# Altium schematic symbol library jlcpcb_2025_04_capacitors_extended_0603.schlib: 3668 symbols (part 8 of 20) (continued)
## CC0603BRNPO9BN1R0
designator C?  Capacitance: 1pF  (hidden comment: *)
Capacitor, Ceramic (MLCC), 1pF, 50V, NP0, SMD 0603; Manufacturer: YAGEO; Manufacturer Part Number: CC0603BRNPO9BN1R0; Package Size: 0603; JLCPCB Basic Part: No; JLCPCB Part Number: C115062; Supplier 1: LCSC; Category: Capacitors - MLCC; Supplier Part Number 1: C115062; Voltage Rating: 50V; Temperature Coefficient: NP0; RoHS: Yes; ComponentLink1Description: Datasheet; ComponentLink1URL: https://wmsc.lcsc.com/wmsc/upload/file/pdf/v2/lcsc/2007151105_YAGEO-CC0603BRNPO9BN1R0_C115062.pdf; ComponentLink2Description: JLCPCB Part URL; ComponentLink2URL: https://jlcpcb.com/partdetail/C115062; ComponentLink3Description: LCSC Part URL; ComponentLink3URL: https://lcsc.com/product-detail/Multilayer-Ceramic-Capacitors-MLCC---SMD-SMT_YAGEO-YAGEO-CC0603BRNPO9BN1R0_C115062.html
footprint CAP-0603 (0603 (1608M) Capacitor)
pins: 1, 2

## CC0603BRNPO9BN1R1
designator C?  Capacitance: 1.1pF  (hidden comment: *)
Capacitor, Ceramic (MLCC), 1.1pF, 50V, NP0, SMD 0603; Manufacturer: YAGEO; Manufacturer Part Number: CC0603BRNPO9BN1R1; Package Size: 0603; JLCPCB Basic Part: No; JLCPCB Part Number: C519097; Supplier 1: LCSC; Category: Capacitors - MLCC; Supplier Part Number 1: C519097; Voltage Rating: 50V; Temperature Coefficient: NP0; RoHS: Yes; ComponentLink1Description: Datasheet; ComponentLink1URL: https://wmsc.lcsc.com/wmsc/upload/file/pdf/v2/lcsc/2007161233_YAGEO-CC0603BRNPO9BN1R1_C519097.pdf; ComponentLink2Description: JLCPCB Part URL; ComponentLink2URL: https://jlcpcb.com/partdetail/C519097; ComponentLink3Description: LCSC Part URL; ComponentLink3URL: https://lcsc.com/product-detail/Multilayer-Ceramic-Capacitors-MLCC---SMD-SMT_YAGEO-YAGEO-CC0603BRNPO9BN1R1_C519097.html
footprint CAP-0603 (0603 (1608M) Capacitor)
pins: 1, 2

## CC0603BRNPO9BN1R2
designator C?  Capacitance: 1.2pF  (hidden comment: *)
Capacitor, Ceramic (MLCC), 1.2pF, 50V, NP0, SMD 0603; Manufacturer: YAGEO; Manufacturer Part Number: CC0603BRNPO9BN1R2; Package Size: 0603; JLCPCB Basic Part: No; JLCPCB Part Number: C519098; Supplier 1: LCSC; Category: Capacitors - MLCC; Supplier Part Number 1: C519098; Voltage Rating: 50V; Temperature Coefficient: NP0; RoHS: Yes; ComponentLink1Description: Datasheet; ComponentLink1URL: https://wmsc.lcsc.com/wmsc/upload/file/pdf/v2/lcsc/2008031233_YAGEO-CC0603BRNPO9BN1R2_C519098.pdf; ComponentLink2Description: JLCPCB Part URL; ComponentLink2URL: https://jlcpcb.com/partdetail/C519098; ComponentLink3Description: LCSC Part URL; ComponentLink3URL: https://lcsc.com/product-detail/Multilayer-Ceramic-Capacitors-MLCC---SMD-SMT_YAGEO-YAGEO-CC0603BRNPO9BN1R2_C519098.html
footprint CAP-0603 (0603 (1608M) Capacitor)
pins: 1, 2

## CC0603BRNPO9BN1R3
designator C?  Capacitance: 1.3pF  (hidden comment: *)
Capacitor, Ceramic (MLCC), 1.3pF, 50V, NP0, SMD 0603; Manufacturer: YAGEO; Manufacturer Part Number: CC0603BRNPO9BN1R3; Package Size: 0603; JLCPCB Basic Part: No; JLCPCB Part Number: C519099; Supplier 1: LCSC; Category: Capacitors - MLCC; Supplier Part Number 1: C519099; Voltage Rating: 50V; Temperature Coefficient: NP0; RoHS: Yes; ComponentLink1Description: Datasheet; ComponentLink1URL: https://wmsc.lcsc.com/wmsc/upload/file/pdf/v2/lcsc/2006011834_YAGEO-CC0603BRNPO9BN1R3_C519099.pdf; ComponentLink2Description: JLCPCB Part URL; ComponentLink2URL: https://jlcpcb.com/partdetail/C519099; ComponentLink3Description: LCSC Part URL; ComponentLink3URL: https://lcsc.com/product-detail/Multilayer-Ceramic-Capacitors-MLCC---SMD-SMT_YAGEO-YAGEO-CC0603BRNPO9BN1R3_C519099.html
footprint CAP-0603 (0603 (1608M) Capacitor)
pins: 1, 2

## CC0603BRNPO9BN1R5
designator C?  Capacitance: 1.5pF  (hidden comment: *)
Capacitor, Ceramic (MLCC), 1.5pF, 50V, NP0, SMD 0603; Manufacturer: YAGEO; Manufacturer Part Number: CC0603BRNPO9BN1R5; Package Size: 0603; JLCPCB Basic Part: No; JLCPCB Part Number: C519100; Supplier 1: LCSC; Category: Capacitors - MLCC; Supplier Part Number 1: C519100; Voltage Rating: 50V; Temperature Coefficient: NP0; RoHS: Yes; ComponentLink1Description: Datasheet; ComponentLink1URL: https://wmsc.lcsc.com/wmsc/upload/file/pdf/v2/lcsc/2005181834_YAGEO-CC0603BRNPO9BN1R5_C519100.pdf; ComponentLink2Description: JLCPCB Part URL; ComponentLink2URL: https://jlcpcb.com/partdetail/C519100; ComponentLink3Description: LCSC Part URL; ComponentLink3URL: https://lcsc.com/product-detail/Multilayer-Ceramic-Capacitors-MLCC---SMD-SMT_YAGEO-YAGEO-CC0603BRNPO9BN1R5_C519100.html
footprint CAP-0603 (0603 (1608M) Capacitor)
pins: 1, 2

## CC0603BRNPO9BN1R8
designator C?  Capacitance: 1.8pF  (hidden comment: *)
Capacitor, Ceramic (MLCC), 1.8pF, 50V, NP0, SMD 0603; Manufacturer: YAGEO; Manufacturer Part Number: CC0603BRNPO9BN1R8; Package Size: 0603; JLCPCB Basic Part: No; JLCPCB Part Number: C519101; Supplier 1: LCSC; Category: Capacitors - MLCC; Supplier Part Number 1: C519101; Voltage Rating: 50V; Temperature Coefficient: NP0; RoHS: Yes; ComponentLink1Description: Datasheet; ComponentLink1URL: https://wmsc.lcsc.com/wmsc/upload/file/pdf/v2/lcsc/2005141203_YAGEO-CC0603BRNPO9BN1R8_C519101.pdf; ComponentLink2Description: JLCPCB Part URL; ComponentLink2URL: https://jlcpcb.com/partdetail/C519101; ComponentLink3Description: LCSC Part URL; ComponentLink3URL: https://lcsc.com/product-detail/Multilayer-Ceramic-Capacitors-MLCC---SMD-SMT_YAGEO-YAGEO-CC0603BRNPO9BN1R8_C519101.html
footprint CAP-0603 (0603 (1608M) Capacitor)
pins: 1, 2

## CC0603BRNPO9BN2R0
designator C?  Capacitance: 2pF  (hidden comment: *)
Capacitor, Ceramic (MLCC), 2pF, 50V, NP0, SMD 0603; Manufacturer: YAGEO; Manufacturer Part Number: CC0603BRNPO9BN2R0; Package Size: 0603; JLCPCB Basic Part: No; JLCPCB Part Number: C513620; Supplier 1: LCSC; Category: Capacitors - MLCC; Supplier Part Number 1: C513620; Voltage Rating: 50V; Temperature Coefficient: NP0; RoHS: Yes; ComponentLink1Description: Datasheet; ComponentLink1URL: https://wmsc.lcsc.com/wmsc/upload/file/pdf/v2/lcsc/2004231433_YAGEO-CC0603BRNPO9BN2R0_C513620.pdf; ComponentLink2Description: JLCPCB Part URL; ComponentLink2URL: https://jlcpcb.com/partdetail/C513620; ComponentLink3Description: LCSC Part URL; ComponentLink3URL: https://lcsc.com/product-detail/Multilayer-Ceramic-Capacitors-MLCC---SMD-SMT_YAGEO-YAGEO-CC0603BRNPO9BN2R0_C513620.html
footprint CAP-0603 (0603 (1608M) Capacitor)
pins: 1, 2

## CC0603BRNPO9BN2R2
designator C?  Capacitance: 2.2pF  (hidden comment: *)
Capacitor, Ceramic (MLCC), 2.2pF, 50V, NP0, SMD 0603; Manufacturer: YAGEO; Manufacturer Part Number: CC0603BRNPO9BN2R2; Package Size: 0603; JLCPCB Basic Part: No; JLCPCB Part Number: C309460; Supplier 1: LCSC; Category: Capacitors - MLCC; Supplier Part Number 1: C309460; Voltage Rating: 50V; Temperature Coefficient: NP0; RoHS: Yes; ComponentLink1Description: Datasheet; ComponentLink1URL: https://wmsc.lcsc.com/wmsc/upload/file/pdf/v2/lcsc/2304140030_YAGEO-CC0603BRNPO9BN2R2_C309460.pdf; ComponentLink2Description: JLCPCB Part URL; ComponentLink2URL: https://jlcpcb.com/partdetail/C309460; ComponentLink3Description: LCSC Part URL; ComponentLink3URL: https://lcsc.com/product-detail/Multilayer-Ceramic-Capacitors-MLCC---SMD-SMT_YAGEO-YAGEO-CC0603BRNPO9BN2R2_C309460.html
footprint CAP-0603 (0603 (1608M) Capacitor)
pins: 1, 2

## CC0603BRNPO9BN2R4
designator C?  Capacitance: 2.4pF  (hidden comment: *)
Capacitor, Ceramic (MLCC), 2.4pF, 50V, NP0, SMD 0603; Manufacturer: YAGEO; Manufacturer Part Number: CC0603BRNPO9BN2R4; Package Size: 0603; JLCPCB Basic Part: No; JLCPCB Part Number: C519102; Supplier 1: LCSC; Category: Capacitors - MLCC; Supplier Part Number 1: C519102; Voltage Rating: 50V; Temperature Coefficient: NP0; RoHS: Yes; ComponentLink1Description: Datasheet; ComponentLink1URL: https://wmsc.lcsc.com/wmsc/upload/file/pdf/v2/lcsc/2007101233_YAGEO-CC0603BRNPO9BN2R4_C519102.pdf; ComponentLink2Description: JLCPCB Part URL; ComponentLink2URL: https://jlcpcb.com/partdetail/C519102; ComponentLink3Description: LCSC Part URL; ComponentLink3URL: https://lcsc.com/product-detail/Multilayer-Ceramic-Capacitors-MLCC---SMD-SMT_YAGEO-YAGEO-CC0603BRNPO9BN2R4_C519102.html
footprint CAP-0603 (0603 (1608M) Capacitor)
pins: 1, 2

## CC0603BRNPO9BN2R5
designator C?  Capacitance: 2.5pF  (hidden comment: *)
Capacitor, Ceramic (MLCC), 2.5pF, 50V, NP0, SMD 0603; Manufacturer: YAGEO; Manufacturer Part Number: CC0603BRNPO9BN2R5; Package Size: 0603; JLCPCB Basic Part: No; JLCPCB Part Number: C519103; Supplier 1: LCSC; Category: Capacitors - MLCC; Supplier Part Number 1: C519103; Voltage Rating: 50V; Temperature Coefficient: NP0; RoHS: Yes; ComponentLink1Description: Datasheet; ComponentLink1URL: https://wmsc.lcsc.com/wmsc/upload/file/pdf/v2/lcsc/2008122133_YAGEO-CC0603BRNPO9BN2R5_C519103.pdf; ComponentLink2Description: JLCPCB Part URL; ComponentLink2URL: https://jlcpcb.com/partdetail/C519103; ComponentLink3Description: LCSC Part URL; ComponentLink3URL: https://lcsc.com/product-detail/Multilayer-Ceramic-Capacitors-MLCC---SMD-SMT_YAGEO-YAGEO-CC0603BRNPO9BN2R5_C519103.html
footprint CAP-0603 (0603 (1608M) Capacitor)
pins: 1, 2

## CC0603BRNPO9BN2R7
designator C?  Capacitance: 2.7pF  (hidden comment: *)
Capacitor, Ceramic (MLCC), 2.7pF, 50V, NP0, SMD 0603; Manufacturer: YAGEO; Manufacturer Part Number: CC0603BRNPO9BN2R7; Package Size: 0603; JLCPCB Basic Part: No; JLCPCB Part Number: C519104; Supplier 1: LCSC; Category: Capacitors - MLCC; Supplier Part Number 1: C519104; Voltage Rating: 50V; Temperature Coefficient: NP0; RoHS: Yes; ComponentLink1Description: Datasheet; ComponentLink1URL: https://wmsc.lcsc.com/wmsc/upload/file/pdf/v2/lcsc/2005141203_YAGEO-CC0603BRNPO9BN2R7_C519104.pdf; ComponentLink2Description: JLCPCB Part URL; ComponentLink2URL: https://jlcpcb.com/partdetail/C519104; ComponentLink3Description: LCSC Part URL; ComponentLink3URL: https://lcsc.com/product-detail/Multilayer-Ceramic-Capacitors-MLCC---SMD-SMT_YAGEO-YAGEO-CC0603BRNPO9BN2R7_C519104.html
footprint CAP-0603 (0603 (1608M) Capacitor)
pins: 1, 2

## CC0603BRNPO9BN3R0
designator C?  Capacitance: 3pF  (hidden comment: *)
Capacitor, Ceramic (MLCC), 3pF, 50V, NP0, SMD 0603; Manufacturer: YAGEO; Manufacturer Part Number: CC0603BRNPO9BN3R0; Package Size: 0603; JLCPCB Basic Part: No; JLCPCB Part Number: C519105; Supplier 1: LCSC; Category: Capacitors - MLCC; Supplier Part Number 1: C519105; Voltage Rating: 50V; Temperature Coefficient: NP0; RoHS: Yes; ComponentLink1Description: Datasheet; ComponentLink1URL: https://wmsc.lcsc.com/wmsc/upload/file/pdf/v2/lcsc/2005141203_YAGEO-CC0603BRNPO9BN3R0_C519105.pdf; ComponentLink2Description: JLCPCB Part URL; ComponentLink2URL: https://jlcpcb.com/partdetail/C519105; ComponentLink3Description: LCSC Part URL; ComponentLink3URL: https://lcsc.com/product-detail/Multilayer-Ceramic-Capacitors-MLCC---SMD-SMT_YAGEO-YAGEO-CC0603BRNPO9BN3R0_C519105.html
footprint CAP-0603 (0603 (1608M) Capacitor)
pins: 1, 2

## CC0603BRNPO9BN3R3
designator C?  Capacitance: 3.3pF  (hidden comment: *)
Capacitor, Ceramic (MLCC), 3.3pF, 50V, NP0, SMD 0603; Manufacturer: YAGEO; Manufacturer Part Number: CC0603BRNPO9BN3R3; Package Size: 0603; JLCPCB Basic Part: No; JLCPCB Part Number: C327275; Supplier 1: LCSC; Category: Capacitors - MLCC; Supplier Part Number 1: C327275; Voltage Rating: 50V; Temperature Coefficient: NP0; RoHS: Yes; ComponentLink1Description: Datasheet; ComponentLink1URL: https://wmsc.lcsc.com/wmsc/upload/file/pdf/v2/lcsc/1811141224_YAGEO-CC0603BRNPO9BN3R3_C327275.pdf; ComponentLink2Description: JLCPCB Part URL; ComponentLink2URL: https://jlcpcb.com/partdetail/C327275; ComponentLink3Description: LCSC Part URL; ComponentLink3URL: https://lcsc.com/product-detail/Multilayer-Ceramic-Capacitors-MLCC---SMD-SMT_YAGEO-YAGEO-CC0603BRNPO9BN3R3_C327275.html
footprint CAP-0603 (0603 (1608M) Capacitor)
pins: 1, 2

## CC0603BRNPO9BN3R6
designator C?  Capacitance: 3.6pF  (hidden comment: *)
Capacitor, Ceramic (MLCC), 3.6pF, 50V, NP0, SMD 0603; Manufacturer: YAGEO; Manufacturer Part Number: CC0603BRNPO9BN3R6; Package Size: 0603; JLCPCB Basic Part: No; JLCPCB Part Number: C519106; Supplier 1: LCSC; Category: Capacitors - MLCC; Supplier Part Number 1: C519106; Voltage Rating: 50V; Temperature Coefficient: NP0; RoHS: Yes; ComponentLink1Description: Datasheet; ComponentLink1URL: https://wmsc.lcsc.com/wmsc/upload/file/pdf/v2/lcsc/2005141203_YAGEO-CC0603BRNPO9BN3R6_C519106.pdf; ComponentLink2Description: JLCPCB Part URL; ComponentLink2URL: https://jlcpcb.com/partdetail/C519106; ComponentLink3Description: LCSC Part URL; ComponentLink3URL: https://lcsc.com/product-detail/Multilayer-Ceramic-Capacitors-MLCC---SMD-SMT_YAGEO-YAGEO-CC0603BRNPO9BN3R6_C519106.html
footprint CAP-0603 (0603 (1608M) Capacitor)
pins: 1, 2

## CC0603BRNPO9BN3R9
designator C?  Capacitance: 3.9pF  (hidden comment: *)
Capacitor, Ceramic (MLCC), 3.9pF, 50V, NP0, SMD 0603; Manufacturer: YAGEO; Manufacturer Part Number: CC0603BRNPO9BN3R9; Package Size: 0603; JLCPCB Basic Part: No; JLCPCB Part Number: C519107; Supplier 1: LCSC; Category: Capacitors - MLCC; Supplier Part Number 1: C519107; Voltage Rating: 50V; Temperature Coefficient: NP0; RoHS: Yes; ComponentLink1Description: Datasheet; ComponentLink1URL: https://wmsc.lcsc.com/wmsc/upload/file/pdf/v2/lcsc/2007231533_YAGEO-CC0603BRNPO9BN3R9_C519107.pdf; ComponentLink2Description: JLCPCB Part URL; ComponentLink2URL: https://jlcpcb.com/partdetail/C519107; ComponentLink3Description: LCSC Part URL; ComponentLink3URL: https://lcsc.com/product-detail/Multilayer-Ceramic-Capacitors-MLCC---SMD-SMT_YAGEO-YAGEO-CC0603BRNPO9BN3R9_C519107.html
footprint CAP-0603 (0603 (1608M) Capacitor)
pins: 1, 2

## CC0603BRNPO9BN4R0
designator C?  Capacitance: 4pF  (hidden comment: *)
Capacitor, Ceramic (MLCC), 4pF, 50V, NP0, SMD 0603; Manufacturer: YAGEO; Manufacturer Part Number: CC0603BRNPO9BN4R0; Package Size: 0603; JLCPCB Basic Part: No; JLCPCB Part Number: C309461; Supplier 1: LCSC; Category: Capacitors - MLCC; Supplier Part Number 1: C309461; Voltage Rating: 50V; Temperature Coefficient: NP0; RoHS: Yes; ComponentLink1Description: Datasheet; ComponentLink1URL: https://wmsc.lcsc.com/wmsc/upload/file/pdf/v2/lcsc/2304140030_YAGEO-CC0603BRNPO9BN4R0_C309461.pdf; ComponentLink2Description: JLCPCB Part URL; ComponentLink2URL: https://jlcpcb.com/partdetail/C309461; ComponentLink3Description: LCSC Part URL; ComponentLink3URL: https://lcsc.com/product-detail/Multilayer-Ceramic-Capacitors-MLCC---SMD-SMT_YAGEO-YAGEO-CC0603BRNPO9BN4R0_C309461.html
footprint CAP-0603 (0603 (1608M) Capacitor)
pins: 1, 2

## CC0603BRNPO9BN4R3
designator C?  Capacitance: 4.3pF  (hidden comment: *)
Capacitor, Ceramic (MLCC), 4.3pF, 50V, NP0, SMD 0603; Manufacturer: YAGEO; Manufacturer Part Number: CC0603BRNPO9BN4R3; Package Size: 0603; JLCPCB Basic Part: No; JLCPCB Part Number: C519108; Supplier 1: LCSC; Category: Capacitors - MLCC; Supplier Part Number 1: C519108; Voltage Rating: 50V; Temperature Coefficient: NP0; RoHS: Yes; ComponentLink1Description: Datasheet; ComponentLink1URL: https://wmsc.lcsc.com/wmsc/upload/file/pdf/v2/lcsc/2005181834_YAGEO-CC0603BRNPO9BN4R3_C519108.pdf; ComponentLink2Description: JLCPCB Part URL; ComponentLink2URL: https://jlcpcb.com/partdetail/C519108; ComponentLink3Description: LCSC Part URL; ComponentLink3URL: https://lcsc.com/product-detail/Multilayer-Ceramic-Capacitors-MLCC---SMD-SMT_YAGEO-YAGEO-CC0603BRNPO9BN4R3_C519108.html
footprint CAP-0603 (0603 (1608M) Capacitor)
pins: 1, 2

## CC0603BRNPO9BN4R7
designator C?  Capacitance: 4.7pF  (hidden comment: *)
Capacitor, Ceramic (MLCC), 4.7pF, 50V, NP0, SMD 0603; Manufacturer: YAGEO; Manufacturer Part Number: CC0603BRNPO9BN4R7; Package Size: 0603; JLCPCB Basic Part: No; JLCPCB Part Number: C327022; Supplier 1: LCSC; Category: Capacitors - MLCC; Supplier Part Number 1: C327022; Voltage Rating: 50V; Temperature Coefficient: NP0; RoHS: Yes; ComponentLink1Description: Datasheet; ComponentLink1URL: https://wmsc.lcsc.com/wmsc/upload/file/pdf/v2/lcsc/1811141226_YAGEO-CC0603BRNPO9BN4R7_C327022.pdf; ComponentLink2Description: JLCPCB Part URL; ComponentLink2URL: https://jlcpcb.com/partdetail/C327022; ComponentLink3Description: LCSC Part URL; ComponentLink3URL: https://lcsc.com/product-detail/Multilayer-Ceramic-Capacitors-MLCC---SMD-SMT_YAGEO-YAGEO-CC0603BRNPO9BN4R7_C327022.html
footprint CAP-0603 (0603 (1608M) Capacitor)
pins: 1, 2

## CC0603BRNPO9BN5R0
designator C?  Capacitance: 5pF  (hidden comment: *)
Capacitor, Ceramic (MLCC), 5pF, 50V, NP0, SMD 0603; Manufacturer: YAGEO; Manufacturer Part Number: CC0603BRNPO9BN5R0; Package Size: 0603; JLCPCB Basic Part: No; JLCPCB Part Number: C519109; Supplier 1: LCSC; Category: Capacitors - MLCC; Supplier Part Number 1: C519109; Voltage Rating: 50V; Temperature Coefficient: NP0; RoHS: Yes; ComponentLink1Description: Datasheet; ComponentLink1URL: https://wmsc.lcsc.com/wmsc/upload/file/pdf/v2/lcsc/2006011834_YAGEO-CC0603BRNPO9BN5R0_C519109.pdf; ComponentLink2Description: JLCPCB Part URL; ComponentLink2URL: https://jlcpcb.com/partdetail/C519109; ComponentLink3Description: LCSC Part URL; ComponentLink3URL: https://lcsc.com/product-detail/Multilayer-Ceramic-Capacitors-MLCC---SMD-SMT_YAGEO-YAGEO-CC0603BRNPO9BN5R0_C519109.html
footprint CAP-0603 (0603 (1608M) Capacitor)
pins: 1, 2

## CC0603BRNPO9BN5R1
designator C?  Capacitance: 5.1pF  (hidden comment: *)
Capacitor, Ceramic (MLCC), 5.1pF, 50V, NP0, SMD 0603; Manufacturer: YAGEO; Manufacturer Part Number: CC0603BRNPO9BN5R1; Package Size: 0603; JLCPCB Basic Part: No; JLCPCB Part Number: C519110; Supplier 1: LCSC; Category: Capacitors - MLCC; Supplier Part Number 1: C519110; Voltage Rating: 50V; Temperature Coefficient: NP0; RoHS: Yes; ComponentLink1Description: Datasheet; ComponentLink1URL: https://wmsc.lcsc.com/wmsc/upload/file/pdf/v2/lcsc/2005181834_YAGEO-CC0603BRNPO9BN5R1_C519110.pdf; ComponentLink2Description: JLCPCB Part URL; ComponentLink2URL: https://jlcpcb.com/partdetail/C519110; ComponentLink3Description: LCSC Part URL; ComponentLink3URL: https://lcsc.com/product-detail/Multilayer-Ceramic-Capacitors-MLCC---SMD-SMT_YAGEO-YAGEO-CC0603BRNPO9BN5R1_C519110.html
footprint CAP-0603 (0603 (1608M) Capacitor)
pins: 1, 2

## CC0603BRNPO9BN5R6
designator C?  Capacitance: 5.6pF  (hidden comment: *)
Capacitor, Ceramic (MLCC), 5.6pF, 50V, NP0, SMD 0603; Manufacturer: YAGEO; Manufacturer Part Number: CC0603BRNPO9BN5R6; Package Size: 0603; JLCPCB Basic Part: No; JLCPCB Part Number: C519111; Supplier 1: LCSC; Category: Capacitors - MLCC; Supplier Part Number 1: C519111; Voltage Rating: 50V; Temperature Coefficient: NP0; RoHS: Yes; ComponentLink1Description: Datasheet; ComponentLink1URL: https://wmsc.lcsc.com/wmsc/upload/file/pdf/v2/lcsc/2005141203_YAGEO-CC0603BRNPO9BN5R6_C519111.pdf; ComponentLink2Description: JLCPCB Part URL; ComponentLink2URL: https://jlcpcb.com/partdetail/C519111; ComponentLink3Description: LCSC Part URL; ComponentLink3URL: https://lcsc.com/product-detail/Multilayer-Ceramic-Capacitors-MLCC---SMD-SMT_YAGEO-YAGEO-CC0603BRNPO9BN5R6_C519111.html
footprint CAP-0603 (0603 (1608M) Capacitor)
pins: 1, 2

## CC0603BRNPO9BN6R0
designator C?  Capacitance: 6pF  (hidden comment: *)
Capacitor, Ceramic (MLCC), 6pF, 50V, NP0, SMD 0603; Manufacturer: YAGEO; Manufacturer Part Number: CC0603BRNPO9BN6R0; Package Size: 0603; JLCPCB Basic Part: No; JLCPCB Part Number: C519112; Supplier 1: LCSC; Category: Capacitors - MLCC; Supplier Part Number 1: C519112; Voltage Rating: 50V; Temperature Coefficient: NP0; RoHS: Yes; ComponentLink1Description: Datasheet; ComponentLink1URL: https://wmsc.lcsc.com/wmsc/upload/file/pdf/v2/lcsc/2008051834_YAGEO-CC0603BRNPO9BN6R0_C519112.pdf; ComponentLink2Description: JLCPCB Part URL; ComponentLink2URL: https://jlcpcb.com/partdetail/C519112; ComponentLink3Description: LCSC Part URL; ComponentLink3URL: https://lcsc.com/product-detail/Multilayer-Ceramic-Capacitors-MLCC---SMD-SMT_YAGEO-YAGEO-CC0603BRNPO9BN6R0_C519112.html
footprint CAP-0603 (0603 (1608M) Capacitor)
pins: 1, 2

## CC0603BRNPO9BN6R2
designator C?  Capacitance: 6.2pF  (hidden comment: *)
Capacitor, Ceramic (MLCC), 6.2pF, 50V, NP0, SMD 0603; Manufacturer: YAGEO; Manufacturer Part Number: CC0603BRNPO9BN6R2; Package Size: 0603; JLCPCB Basic Part: No; JLCPCB Part Number: C519113; Supplier 1: LCSC; Category: Capacitors - MLCC; Supplier Part Number 1: C519113; Voltage Rating: 50V; Temperature Coefficient: NP0; RoHS: Yes; ComponentLink1Description: Datasheet; ComponentLink1URL: https://wmsc.lcsc.com/wmsc/upload/file/pdf/v2/lcsc/2005181834_YAGEO-CC0603BRNPO9BN6R2_C519113.pdf; ComponentLink2Description: JLCPCB Part URL; ComponentLink2URL: https://jlcpcb.com/partdetail/C519113; ComponentLink3Description: LCSC Part URL; ComponentLink3URL: https://lcsc.com/product-detail/Multilayer-Ceramic-Capacitors-MLCC---SMD-SMT_YAGEO-YAGEO-CC0603BRNPO9BN6R2_C519113.html
footprint CAP-0603 (0603 (1608M) Capacitor)
pins: 1, 2

## CC0603BRNPO9BN6R8
designator C?  Capacitance: 6.8pF  (hidden comment: *)
Capacitor, Ceramic (MLCC), 6.8pF, 50V, NP0, SMD 0603; Manufacturer: YAGEO; Manufacturer Part Number: CC0603BRNPO9BN6R8; Package Size: 0603; JLCPCB Basic Part: No; JLCPCB Part Number: C519114; Supplier 1: LCSC; Category: Capacitors - MLCC; Supplier Part Number 1: C519114; Voltage Rating: 50V; Temperature Coefficient: NP0; RoHS: Yes; ComponentLink1Description: Datasheet; ComponentLink1URL: https://wmsc.lcsc.com/wmsc/upload/file/pdf/v2/lcsc/2006011834_YAGEO-CC0603BRNPO9BN6R8_C519114.pdf; ComponentLink2Description: JLCPCB Part URL; ComponentLink2URL: https://jlcpcb.com/partdetail/C519114; ComponentLink3Description: LCSC Part URL; ComponentLink3URL: https://lcsc.com/product-detail/Multilayer-Ceramic-Capacitors-MLCC---SMD-SMT_YAGEO-YAGEO-CC0603BRNPO9BN6R8_C519114.html
footprint CAP-0603 (0603 (1608M) Capacitor)
pins: 1, 2

## CC0603BRNPO9BN7R0
designator C?  Capacitance: 7pF  (hidden comment: *)
Capacitor, Ceramic (MLCC), 7pF, 50V, NP0, SMD 0603; Manufacturer: YAGEO; Manufacturer Part Number: CC0603BRNPO9BN7R0; Package Size: 0603; JLCPCB Basic Part: No; JLCPCB Part Number: C519115; Supplier 1: LCSC; Category: Capacitors - MLCC; Supplier Part Number 1: C519115; Voltage Rating: 50V; Temperature Coefficient: NP0; RoHS: Yes; ComponentLink1Description: Datasheet; ComponentLink1URL: https://wmsc.lcsc.com/wmsc/upload/file/pdf/v2/lcsc/2005141203_YAGEO-CC0603BRNPO9BN7R0_C519115.pdf; ComponentLink2Description: JLCPCB Part URL; ComponentLink2URL: https://jlcpcb.com/partdetail/C519115; ComponentLink3Description: LCSC Part URL; ComponentLink3URL: https://lcsc.com/product-detail/Multilayer-Ceramic-Capacitors-MLCC---SMD-SMT_YAGEO-YAGEO-CC0603BRNPO9BN7R0_C519115.html
footprint CAP-0603 (0603 (1608M) Capacitor)
pins: 1, 2

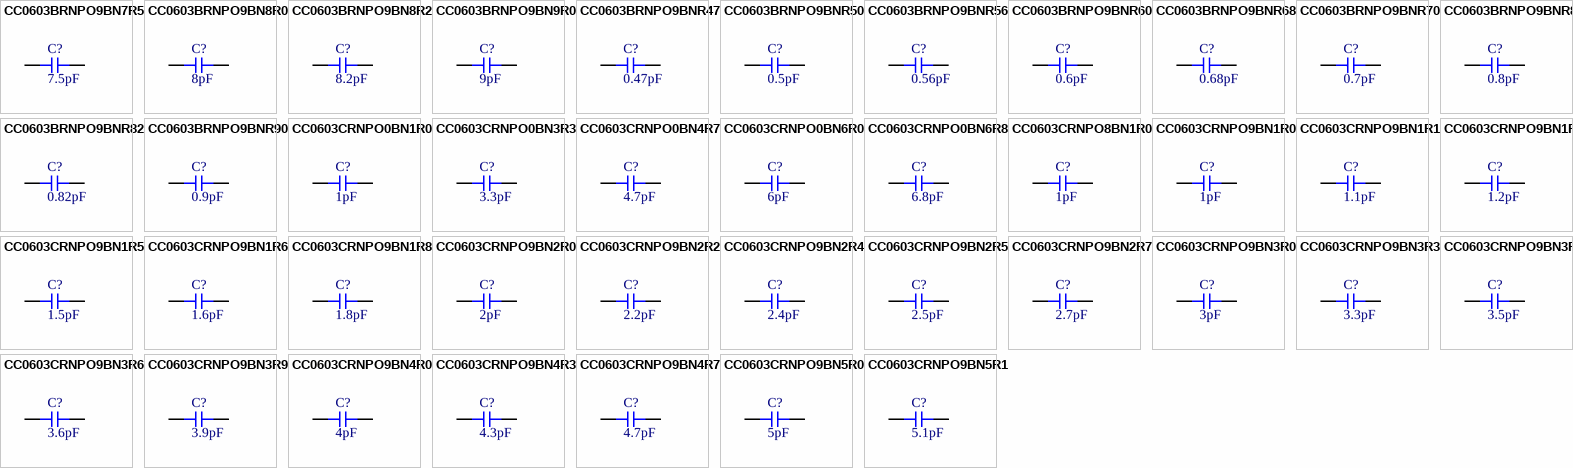
[diagram p34: symbols CC0603BRNPO9BN7R5 to CC0603CRNPO9BN5R1]

## CC0603BRNPO9BN7R5
designator C?  Capacitance: 7.5pF  (hidden comment: *)
Capacitor, Ceramic (MLCC), 7.5pF, 50V, NP0, SMD 0603; Manufacturer: YAGEO; Manufacturer Part Number: CC0603BRNPO9BN7R5; Package Size: 0603; JLCPCB Basic Part: No; JLCPCB Part Number: C519116; Supplier 1: LCSC; Category: Capacitors - MLCC; Supplier Part Number 1: C519116; Voltage Rating: 50V; Temperature Coefficient: NP0; RoHS: Yes; ComponentLink1Description: Datasheet; ComponentLink1URL: https://wmsc.lcsc.com/wmsc/upload/file/pdf/v2/lcsc/2009111706_YAGEO-CC0603BRNPO9BN7R5_C519116.pdf; ComponentLink2Description: JLCPCB Part URL; ComponentLink2URL: https://jlcpcb.com/partdetail/C519116; ComponentLink3Description: LCSC Part URL; ComponentLink3URL: https://lcsc.com/product-detail/Multilayer-Ceramic-Capacitors-MLCC---SMD-SMT_YAGEO-YAGEO-CC0603BRNPO9BN7R5_C519116.html
footprint CAP-0603 (0603 (1608M) Capacitor)
pins: 1, 2

## CC0603BRNPO9BN8R0
designator C?  Capacitance: 8pF  (hidden comment: *)
Capacitor, Ceramic (MLCC), 8pF, 50V, NP0, SMD 0603; Manufacturer: YAGEO; Manufacturer Part Number: CC0603BRNPO9BN8R0; Package Size: 0603; JLCPCB Basic Part: No; JLCPCB Part Number: C519117; Supplier 1: LCSC; Category: Capacitors - MLCC; Supplier Part Number 1: C519117; Voltage Rating: 50V; Temperature Coefficient: NP0; RoHS: Yes; ComponentLink1Description: Datasheet; ComponentLink1URL: https://wmsc.lcsc.com/wmsc/upload/file/pdf/v2/lcsc/2006011834_YAGEO-CC0603BRNPO9BN8R0_C519117.pdf; ComponentLink2Description: JLCPCB Part URL; ComponentLink2URL: https://jlcpcb.com/partdetail/C519117; ComponentLink3Description: LCSC Part URL; ComponentLink3URL: https://lcsc.com/product-detail/Multilayer-Ceramic-Capacitors-MLCC---SMD-SMT_YAGEO-YAGEO-CC0603BRNPO9BN8R0_C519117.html
footprint CAP-0603 (0603 (1608M) Capacitor)
pins: 1, 2

## CC0603BRNPO9BN8R2
designator C?  Capacitance: 8.2pF  (hidden comment: *)
Capacitor, Ceramic (MLCC), 8.2pF, 50V, NP0, SMD 0603; Manufacturer: YAGEO; Manufacturer Part Number: CC0603BRNPO9BN8R2; Package Size: 0603; JLCPCB Basic Part: No; JLCPCB Part Number: C519118; Supplier 1: LCSC; Category: Capacitors - MLCC; Supplier Part Number 1: C519118; Voltage Rating: 50V; Temperature Coefficient: NP0; RoHS: Yes; ComponentLink1Description: Datasheet; ComponentLink1URL: https://wmsc.lcsc.com/wmsc/upload/file/pdf/v2/lcsc/2005181834_YAGEO-CC0603BRNPO9BN8R2_C519118.pdf; ComponentLink2Description: JLCPCB Part URL; ComponentLink2URL: https://jlcpcb.com/partdetail/C519118; ComponentLink3Description: LCSC Part URL; ComponentLink3URL: https://lcsc.com/product-detail/Multilayer-Ceramic-Capacitors-MLCC---SMD-SMT_YAGEO-YAGEO-CC0603BRNPO9BN8R2_C519118.html
footprint CAP-0603 (0603 (1608M) Capacitor)
pins: 1, 2

## CC0603BRNPO9BN9R0
designator C?  Capacitance: 9pF  (hidden comment: *)
Capacitor, Ceramic (MLCC), 9pF, 50V, NP0, SMD 0603; Manufacturer: YAGEO; Manufacturer Part Number: CC0603BRNPO9BN9R0; Package Size: 0603; JLCPCB Basic Part: No; JLCPCB Part Number: C519119; Supplier 1: LCSC; Category: Capacitors - MLCC; Supplier Part Number 1: C519119; Voltage Rating: 50V; Temperature Coefficient: NP0; RoHS: Yes; ComponentLink1Description: Datasheet; ComponentLink1URL: https://wmsc.lcsc.com/wmsc/upload/file/pdf/v2/lcsc/2006011834_YAGEO-CC0603BRNPO9BN9R0_C519119.pdf; ComponentLink2Description: JLCPCB Part URL; ComponentLink2URL: https://jlcpcb.com/partdetail/C519119; ComponentLink3Description: LCSC Part URL; ComponentLink3URL: https://lcsc.com/product-detail/Multilayer-Ceramic-Capacitors-MLCC---SMD-SMT_YAGEO-YAGEO-CC0603BRNPO9BN9R0_C519119.html
footprint CAP-0603 (0603 (1608M) Capacitor)
pins: 1, 2

## CC0603BRNPO9BNR47
designator C?  Capacitance: 0.47pF  (hidden comment: *)
Capacitor, Ceramic (MLCC), 0.47pF, 50V, NP0, SMD 0603; Manufacturer: YAGEO; Manufacturer Part Number: CC0603BRNPO9BNR47; Package Size: 0603; JLCPCB Basic Part: No; JLCPCB Part Number: C519120; Supplier 1: LCSC; Category: Capacitors - MLCC; Supplier Part Number 1: C519120; Voltage Rating: 50V; Temperature Coefficient: NP0; RoHS: Yes; ComponentLink1Description: Datasheet; ComponentLink1URL: https://wmsc.lcsc.com/wmsc/upload/file/pdf/v2/lcsc/2005141203_YAGEO-CC0603BRNPO9BNR47_C519120.pdf; ComponentLink2Description: JLCPCB Part URL; ComponentLink2URL: https://jlcpcb.com/partdetail/C519120; ComponentLink3Description: LCSC Part URL; ComponentLink3URL: https://lcsc.com/product-detail/Multilayer-Ceramic-Capacitors-MLCC---SMD-SMT_YAGEO-YAGEO-CC0603BRNPO9BNR47_C519120.html
footprint CAP-0603 (0603 (1608M) Capacitor)
pins: 1, 2

## CC0603BRNPO9BNR50
designator C?  Capacitance: 0.5pF  (hidden comment: *)
Capacitor, Ceramic (MLCC), 0.5pF, 50V, NP0, SMD 0603; Manufacturer: YAGEO; Manufacturer Part Number: CC0603BRNPO9BNR50; Package Size: 0603; JLCPCB Basic Part: No; JLCPCB Part Number: C134254; Supplier 1: LCSC; Category: Capacitors - MLCC; Supplier Part Number 1: C134254; Voltage Rating: 50V; Temperature Coefficient: NP0; RoHS: Yes; ComponentLink1Description: Datasheet; ComponentLink1URL: https://wmsc.lcsc.com/wmsc/upload/file/pdf/v2/lcsc/2304140030_YAGEO-CC0603BRNPO9BNR50_C134254.pdf; ComponentLink2Description: JLCPCB Part URL; ComponentLink2URL: https://jlcpcb.com/partdetail/C134254; ComponentLink3Description: LCSC Part URL; ComponentLink3URL: https://lcsc.com/product-detail/Multilayer-Ceramic-Capacitors-MLCC---SMD-SMT_YAGEO-YAGEO-CC0603BRNPO9BNR50_C134254.html
footprint CAP-0603 (0603 (1608M) Capacitor)
pins: 1, 2

## CC0603BRNPO9BNR56
designator C?  Capacitance: 0.56pF  (hidden comment: *)
Capacitor, Ceramic (MLCC), 0.56pF, 50V, NP0, SMD 0603; Manufacturer: YAGEO; Manufacturer Part Number: CC0603BRNPO9BNR56; Package Size: 0603; JLCPCB Basic Part: No; JLCPCB Part Number: C519121; Supplier 1: LCSC; Category: Capacitors - MLCC; Supplier Part Number 1: C519121; Voltage Rating: 50V; Temperature Coefficient: NP0; RoHS: Yes; ComponentLink1Description: Datasheet; ComponentLink1URL: https://wmsc.lcsc.com/wmsc/upload/file/pdf/v2/lcsc/2006011834_YAGEO-CC0603BRNPO9BNR56_C519121.pdf; ComponentLink2Description: JLCPCB Part URL; ComponentLink2URL: https://jlcpcb.com/partdetail/C519121; ComponentLink3Description: LCSC Part URL; ComponentLink3URL: https://lcsc.com/product-detail/Multilayer-Ceramic-Capacitors-MLCC---SMD-SMT_YAGEO-YAGEO-CC0603BRNPO9BNR56_C519121.html
footprint CAP-0603 (0603 (1608M) Capacitor)
pins: 1, 2

## CC0603BRNPO9BNR60
designator C?  Capacitance: 0.6pF  (hidden comment: *)
Capacitor, Ceramic (MLCC), 0.6pF, 50V, NP0, SMD 0603; Manufacturer: YAGEO; Manufacturer Part Number: CC0603BRNPO9BNR60; Package Size: 0603; JLCPCB Basic Part: No; JLCPCB Part Number: C519122; Supplier 1: LCSC; Category: Capacitors - MLCC; Supplier Part Number 1: C519122; Voltage Rating: 50V; Temperature Coefficient: NP0; RoHS: Yes; ComponentLink1Description: Datasheet; ComponentLink1URL: https://wmsc.lcsc.com/wmsc/upload/file/pdf/v2/lcsc/2007161233_YAGEO-CC0603BRNPO9BNR60_C519122.pdf; ComponentLink2Description: JLCPCB Part URL; ComponentLink2URL: https://jlcpcb.com/partdetail/C519122; ComponentLink3Description: LCSC Part URL; ComponentLink3URL: https://lcsc.com/product-detail/Multilayer-Ceramic-Capacitors-MLCC---SMD-SMT_YAGEO-YAGEO-CC0603BRNPO9BNR60_C519122.html
footprint CAP-0603 (0603 (1608M) Capacitor)
pins: 1, 2

## CC0603BRNPO9BNR68
designator C?  Capacitance: 0.68pF  (hidden comment: *)
Capacitor, Ceramic (MLCC), 0.68pF, 50V, NP0, SMD 0603; Manufacturer: YAGEO; Manufacturer Part Number: CC0603BRNPO9BNR68; Package Size: 0603; JLCPCB Basic Part: No; JLCPCB Part Number: C519123; Supplier 1: LCSC; Category: Capacitors - MLCC; Supplier Part Number 1: C519123; Voltage Rating: 50V; Temperature Coefficient: NP0; RoHS: Yes; ComponentLink1Description: Datasheet; ComponentLink1URL: https://wmsc.lcsc.com/wmsc/upload/file/pdf/v2/lcsc/2005141203_YAGEO-CC0603BRNPO9BNR68_C519123.pdf; ComponentLink2Description: JLCPCB Part URL; ComponentLink2URL: https://jlcpcb.com/partdetail/C519123; ComponentLink3Description: LCSC Part URL; ComponentLink3URL: https://lcsc.com/product-detail/Multilayer-Ceramic-Capacitors-MLCC---SMD-SMT_YAGEO-YAGEO-CC0603BRNPO9BNR68_C519123.html
footprint CAP-0603 (0603 (1608M) Capacitor)
pins: 1, 2

## CC0603BRNPO9BNR70
designator C?  Capacitance: 0.7pF  (hidden comment: *)
Capacitor, Ceramic (MLCC), 0.7pF, 50V, NP0, SMD 0603; Manufacturer: YAGEO; Manufacturer Part Number: CC0603BRNPO9BNR70; Package Size: 0603; JLCPCB Basic Part: No; JLCPCB Part Number: C519367; Supplier 1: LCSC; Category: Capacitors - MLCC; Supplier Part Number 1: C519367; Voltage Rating: 50V; Temperature Coefficient: NP0; RoHS: Yes; ComponentLink1Description: Datasheet; ComponentLink1URL: https://wmsc.lcsc.com/wmsc/upload/file/pdf/v2/lcsc/2006011834_YAGEO-CC0603BRNPO9BNR70_C519367.pdf; ComponentLink2Description: JLCPCB Part URL; ComponentLink2URL: https://jlcpcb.com/partdetail/C519367; ComponentLink3Description: LCSC Part URL; ComponentLink3URL: https://lcsc.com/product-detail/Multilayer-Ceramic-Capacitors-MLCC---SMD-SMT_YAGEO-YAGEO-CC0603BRNPO9BNR70_C519367.html
footprint CAP-0603 (0603 (1608M) Capacitor)
pins: 1, 2

## CC0603BRNPO9BNR80
designator C?  Capacitance: 0.8pF  (hidden comment: *)
Capacitor, Ceramic (MLCC), 0.8pF, 50V, NP0, SMD 0603; Manufacturer: YAGEO; Manufacturer Part Number: CC0603BRNPO9BNR80; Package Size: 0603; JLCPCB Basic Part: No; JLCPCB Part Number: C519369; Supplier 1: LCSC; Category: Capacitors - MLCC; Supplier Part Number 1: C519369; Voltage Rating: 50V; Temperature Coefficient: NP0; RoHS: Yes; ComponentLink1Description: Datasheet; ComponentLink1URL: https://wmsc.lcsc.com/wmsc/upload/file/pdf/v2/lcsc/2005141203_YAGEO-CC0603BRNPO9BNR80_C519369.pdf; ComponentLink2Description: JLCPCB Part URL; ComponentLink2URL: https://jlcpcb.com/partdetail/C519369; ComponentLink3Description: LCSC Part URL; ComponentLink3URL: https://lcsc.com/product-detail/Multilayer-Ceramic-Capacitors-MLCC---SMD-SMT_YAGEO-YAGEO-CC0603BRNPO9BNR80_C519369.html
footprint CAP-0603 (0603 (1608M) Capacitor)
pins: 1, 2

## CC0603BRNPO9BNR82
designator C?  Capacitance: 0.82pF  (hidden comment: *)
Capacitor, Ceramic (MLCC), 0.82pF, 50V, NP0, SMD 0603; Manufacturer: YAGEO; Manufacturer Part Number: CC0603BRNPO9BNR82; Package Size: 0603; JLCPCB Basic Part: No; JLCPCB Part Number: C519370; Supplier 1: LCSC; Category: Capacitors - MLCC; Supplier Part Number 1: C519370; Voltage Rating: 50V; Temperature Coefficient: NP0; RoHS: Yes; ComponentLink1Description: Datasheet; ComponentLink1URL: https://wmsc.lcsc.com/wmsc/upload/file/pdf/v2/lcsc/2005181834_YAGEO-CC0603BRNPO9BNR82_C519370.pdf; ComponentLink2Description: JLCPCB Part URL; ComponentLink2URL: https://jlcpcb.com/partdetail/C519370; ComponentLink3Description: LCSC Part URL; ComponentLink3URL: https://lcsc.com/product-detail/Multilayer-Ceramic-Capacitors-MLCC---SMD-SMT_YAGEO-YAGEO-CC0603BRNPO9BNR82_C519370.html
footprint CAP-0603 (0603 (1608M) Capacitor)
pins: 1, 2

## CC0603BRNPO9BNR90
designator C?  Capacitance: 0.9pF  (hidden comment: *)
Capacitor, Ceramic (MLCC), 0.9pF, 50V, NP0, SMD 0603; Manufacturer: YAGEO; Manufacturer Part Number: CC0603BRNPO9BNR90; Package Size: 0603; JLCPCB Basic Part: No; JLCPCB Part Number: C519371; Supplier 1: LCSC; Category: Capacitors - MLCC; Supplier Part Number 1: C519371; Voltage Rating: 50V; Temperature Coefficient: NP0; RoHS: Yes; ComponentLink1Description: Datasheet; ComponentLink1URL: https://wmsc.lcsc.com/wmsc/upload/file/pdf/v2/lcsc/2006011834_YAGEO-CC0603BRNPO9BNR90_C519371.pdf; ComponentLink2Description: JLCPCB Part URL; ComponentLink2URL: https://jlcpcb.com/partdetail/C519371; ComponentLink3Description: LCSC Part URL; ComponentLink3URL: https://lcsc.com/product-detail/Multilayer-Ceramic-Capacitors-MLCC---SMD-SMT_YAGEO-YAGEO-CC0603BRNPO9BNR90_C519371.html
footprint CAP-0603 (0603 (1608M) Capacitor)
pins: 1, 2

## CC0603CRNPO0BN1R0
designator C?  Capacitance: 1pF  (hidden comment: *)
Capacitor, Ceramic (MLCC), 1pF, 100V, NP0, SMD 0603; Manufacturer: YAGEO; Manufacturer Part Number: CC0603CRNPO0BN1R0; Package Size: 0603; JLCPCB Basic Part: No; JLCPCB Part Number: C527035; Supplier 1: LCSC; Category: Capacitors - MLCC; Supplier Part Number 1: C527035; Voltage Rating: 100V; Temperature Coefficient: NP0; RoHS: Yes; ComponentLink1Description: Datasheet; ComponentLink1URL: https://wmsc.lcsc.com/wmsc/upload/file/pdf/v2/lcsc/2006241834_YAGEO-CC0603CRNPO0BN1R0_C527035.pdf; ComponentLink2Description: JLCPCB Part URL; ComponentLink2URL: https://jlcpcb.com/partdetail/C527035; ComponentLink3Description: LCSC Part URL; ComponentLink3URL: https://lcsc.com/product-detail/Multilayer-Ceramic-Capacitors-MLCC---SMD-SMT_YAGEO-YAGEO-CC0603CRNPO0BN1R0_C527035.html
footprint CAP-0603 (0603 (1608M) Capacitor)
pins: 1, 2

## CC0603CRNPO0BN3R3
designator C?  Capacitance: 3.3pF  (hidden comment: *)
Capacitor, Ceramic (MLCC), 3.3pF, 100V, NP0, SMD 0603; Manufacturer: YAGEO; Manufacturer Part Number: CC0603CRNPO0BN3R3; Package Size: 0603; JLCPCB Basic Part: No; JLCPCB Part Number: C527036; Supplier 1: LCSC; Category: Capacitors - MLCC; Supplier Part Number 1: C527036; Voltage Rating: 100V; Temperature Coefficient: NP0; RoHS: Yes; ComponentLink1Description: Datasheet; ComponentLink1URL: https://wmsc.lcsc.com/wmsc/upload/file/pdf/v2/lcsc/2007171236_YAGEO-CC0603CRNPO0BN3R3_C527036.pdf; ComponentLink2Description: JLCPCB Part URL; ComponentLink2URL: https://jlcpcb.com/partdetail/C527036; ComponentLink3Description: LCSC Part URL; ComponentLink3URL: https://lcsc.com/product-detail/Multilayer-Ceramic-Capacitors-MLCC---SMD-SMT_YAGEO-YAGEO-CC0603CRNPO0BN3R3_C527036.html
footprint CAP-0603 (0603 (1608M) Capacitor)
pins: 1, 2

## CC0603CRNPO0BN4R7
designator C?  Capacitance: 4.7pF  (hidden comment: *)
Capacitor, Ceramic (MLCC), 4.7pF, 100V, NP0, SMD 0603; Manufacturer: YAGEO; Manufacturer Part Number: CC0603CRNPO0BN4R7; Package Size: 0603; JLCPCB Basic Part: No; JLCPCB Part Number: C527037; Supplier 1: LCSC; Category: Capacitors - MLCC; Supplier Part Number 1: C527037; Voltage Rating: 100V; Temperature Coefficient: NP0; RoHS: Yes; ComponentLink1Description: Datasheet; ComponentLink1URL: https://wmsc.lcsc.com/wmsc/upload/file/pdf/v2/lcsc/2005261832_YAGEO-CC0603CRNPO0BN4R7_C527037.pdf; ComponentLink2Description: JLCPCB Part URL; ComponentLink2URL: https://jlcpcb.com/partdetail/C527037; ComponentLink3Description: LCSC Part URL; ComponentLink3URL: https://lcsc.com/product-detail/Multilayer-Ceramic-Capacitors-MLCC---SMD-SMT_YAGEO-YAGEO-CC0603CRNPO0BN4R7_C527037.html
footprint CAP-0603 (0603 (1608M) Capacitor)
pins: 1, 2

## CC0603CRNPO0BN6R0
designator C?  Capacitance: 6pF  (hidden comment: *)
Capacitor, Ceramic (MLCC), 6pF, 100V, NP0, SMD 0603; Manufacturer: YAGEO; Manufacturer Part Number: CC0603CRNPO0BN6R0; Package Size: 0603; JLCPCB Basic Part: No; JLCPCB Part Number: C1853005; Supplier 1: LCSC; Category: Capacitors - MLCC; Supplier Part Number 1: C1853005; Voltage Rating: 100V; Temperature Coefficient: NP0; RoHS: Yes; ComponentLink1Description: Datasheet; ComponentLink1URL: https://wmsc.lcsc.com/wmsc/upload/file/pdf/v2/lcsc/2201271030_YAGEO-CC0603CRNPO0BN6R0_C1853005.pdf; ComponentLink2Description: JLCPCB Part URL; ComponentLink2URL: https://jlcpcb.com/partdetail/C1853005; ComponentLink3Description: LCSC Part URL; ComponentLink3URL: https://lcsc.com/product-detail/Multilayer-Ceramic-Capacitors-MLCC---SMD-SMT_YAGEO-YAGEO-CC0603CRNPO0BN6R0_C1853005.html
footprint CAP-0603 (0603 (1608M) Capacitor)
pins: 1, 2

## CC0603CRNPO0BN6R8
designator C?  Capacitance: 6.8pF  (hidden comment: *)
Capacitor, Ceramic (MLCC), 6.8pF, 100V, NP0, SMD 0603; Manufacturer: YAGEO; Manufacturer Part Number: CC0603CRNPO0BN6R8; Package Size: 0603; JLCPCB Basic Part: No; JLCPCB Part Number: C527038; Supplier 1: LCSC; Category: Capacitors - MLCC; Supplier Part Number 1: C527038; Voltage Rating: 100V; Temperature Coefficient: NP0; RoHS: Yes; ComponentLink1Description: Datasheet; ComponentLink1URL: https://wmsc.lcsc.com/wmsc/upload/file/pdf/v2/lcsc/2005262134_YAGEO-CC0603CRNPO0BN6R8_C527038.pdf; ComponentLink2Description: JLCPCB Part URL; ComponentLink2URL: https://jlcpcb.com/partdetail/C527038; ComponentLink3Description: LCSC Part URL; ComponentLink3URL: https://lcsc.com/product-detail/Multilayer-Ceramic-Capacitors-MLCC---SMD-SMT_YAGEO-YAGEO-CC0603CRNPO0BN6R8_C527038.html
footprint CAP-0603 (0603 (1608M) Capacitor)
pins: 1, 2

## CC0603CRNPO8BN1R0
designator C?  Capacitance: 1pF  (hidden comment: *)
Capacitor, Ceramic (MLCC), 1pF, 25V, NP0, SMD 0603; Manufacturer: YAGEO; Manufacturer Part Number: CC0603CRNPO8BN1R0; Package Size: 0603; JLCPCB Basic Part: No; JLCPCB Part Number: C519372; Supplier 1: LCSC; Category: Capacitors - MLCC; Supplier Part Number 1: C519372; Voltage Rating: 25V; Temperature Coefficient: NP0; RoHS: Yes; ComponentLink1Description: Datasheet; ComponentLink1URL: https://wmsc.lcsc.com/wmsc/upload/file/pdf/v2/lcsc/2008122133_YAGEO-CC0603CRNPO8BN1R0_C519372.pdf; ComponentLink2Description: JLCPCB Part URL; ComponentLink2URL: https://jlcpcb.com/partdetail/C519372; ComponentLink3Description: LCSC Part URL; ComponentLink3URL: https://lcsc.com/product-detail/Multilayer-Ceramic-Capacitors-MLCC---SMD-SMT_YAGEO-YAGEO-CC0603CRNPO8BN1R0_C519372.html
footprint CAP-0603 (0603 (1608M) Capacitor)
pins: 1, 2

## CC0603CRNPO9BN1R0
designator C?  Capacitance: 1pF  (hidden comment: *)
Capacitor, Ceramic (MLCC), 1pF, 50V, NP0, SMD 0603; Manufacturer: YAGEO; Manufacturer Part Number: CC0603CRNPO9BN1R0; Package Size: 0603; JLCPCB Basic Part: No; JLCPCB Part Number: C277513; Supplier 1: LCSC; Category: Capacitors - MLCC; Supplier Part Number 1: C277513; Voltage Rating: 50V; Temperature Coefficient: NP0; RoHS: Yes; ComponentLink1Description: Datasheet; ComponentLink1URL: https://wmsc.lcsc.com/wmsc/upload/file/pdf/v2/lcsc/2304140030_YAGEO-CC0603CRNPO9BN1R0_C277513.pdf; ComponentLink2Description: JLCPCB Part URL; ComponentLink2URL: https://jlcpcb.com/partdetail/C277513; ComponentLink3Description: LCSC Part URL; ComponentLink3URL: https://lcsc.com/product-detail/Multilayer-Ceramic-Capacitors-MLCC---SMD-SMT_YAGEO-YAGEO-CC0603CRNPO9BN1R0_C277513.html
footprint CAP-0603 (0603 (1608M) Capacitor)
pins: 1, 2

## CC0603CRNPO9BN1R1
designator C?  Capacitance: 1.1pF  (hidden comment: *)
Capacitor, Ceramic (MLCC), 1.1pF, 50V, NP0, SMD 0603; Manufacturer: YAGEO; Manufacturer Part Number: CC0603CRNPO9BN1R1; Package Size: 0603; JLCPCB Basic Part: No; JLCPCB Part Number: C519373; Supplier 1: LCSC; Category: Capacitors - MLCC; Supplier Part Number 1: C519373; Voltage Rating: 50V; Temperature Coefficient: NP0; RoHS: Yes; ComponentLink1Description: Datasheet; ComponentLink1URL: https://wmsc.lcsc.com/wmsc/upload/file/pdf/v2/lcsc/2012162139_YAGEO-CC0603CRNPO9BN1R1_C519373.pdf; ComponentLink2Description: JLCPCB Part URL; ComponentLink2URL: https://jlcpcb.com/partdetail/C519373; ComponentLink3Description: LCSC Part URL; ComponentLink3URL: https://lcsc.com/product-detail/Multilayer-Ceramic-Capacitors-MLCC---SMD-SMT_YAGEO-YAGEO-CC0603CRNPO9BN1R1_C519373.html
footprint CAP-0603 (0603 (1608M) Capacitor)
pins: 1, 2

## CC0603CRNPO9BN1R2
designator C?  Capacitance: 1.2pF  (hidden comment: *)
Capacitor, Ceramic (MLCC), 1.2pF, 50V, NP0, SMD 0603; Manufacturer: YAGEO; Manufacturer Part Number: CC0603CRNPO9BN1R2; Package Size: 0603; JLCPCB Basic Part: No; JLCPCB Part Number: C281768; Supplier 1: LCSC; Category: Capacitors - MLCC; Supplier Part Number 1: C281768; Voltage Rating: 50V; Temperature Coefficient: NP0; RoHS: Yes; ComponentLink1Description: Datasheet; ComponentLink1URL: https://wmsc.lcsc.com/wmsc/upload/file/pdf/v2/lcsc/2304140030_YAGEO-CC0603CRNPO9BN1R2_C281768.pdf; ComponentLink2Description: JLCPCB Part URL; ComponentLink2URL: https://jlcpcb.com/partdetail/C281768; ComponentLink3Description: LCSC Part URL; ComponentLink3URL: https://lcsc.com/product-detail/Multilayer-Ceramic-Capacitors-MLCC---SMD-SMT_YAGEO-YAGEO-CC0603CRNPO9BN1R2_C281768.html
footprint CAP-0603 (0603 (1608M) Capacitor)
pins: 1, 2

## CC0603CRNPO9BN1R5
designator C?  Capacitance: 1.5pF  (hidden comment: *)
Capacitor, Ceramic (MLCC), 1.5pF, 50V, NP0, SMD 0603; Manufacturer: YAGEO; Manufacturer Part Number: CC0603CRNPO9BN1R5; Package Size: 0603; JLCPCB Basic Part: No; JLCPCB Part Number: C163551; Supplier 1: LCSC; Category: Capacitors - MLCC; Supplier Part Number 1: C163551; Voltage Rating: 50V; Temperature Coefficient: NP0; RoHS: Yes; ComponentLink1Description: Datasheet; ComponentLink1URL: https://wmsc.lcsc.com/wmsc/upload/file/pdf/v2/lcsc/2304140030_YAGEO-CC0603CRNPO9BN1R5_C163551.pdf; ComponentLink2Description: JLCPCB Part URL; ComponentLink2URL: https://jlcpcb.com/partdetail/C163551; ComponentLink3Description: LCSC Part URL; ComponentLink3URL: https://lcsc.com/product-detail/Multilayer-Ceramic-Capacitors-MLCC---SMD-SMT_YAGEO-YAGEO-CC0603CRNPO9BN1R5_C163551.html
footprint CAP-0603 (0603 (1608M) Capacitor)
pins: 1, 2

## CC0603CRNPO9BN1R6
designator C?  Capacitance: 1.6pF  (hidden comment: *)
Capacitor, Ceramic (MLCC), 1.6pF, null, NP0, SMD 0603; Manufacturer: YAGEO; Manufacturer Part Number: CC0603CRNPO9BN1R6; Package Size: 0603; JLCPCB Basic Part: No; JLCPCB Part Number: C5182421; Supplier 1: LCSC; Category: Capacitors - MLCC; Supplier Part Number 1: C5182421; Voltage Rating: null; Temperature Coefficient: NP0; RoHS: Yes; ComponentLink1Description: Datasheet; ComponentLink1URL: https://wmsc.lcsc.com/wmsc/upload/file/pdf/v2/lcsc/2212222008_YAGEO-CC0603CRNPO9BN1R6_C5182421.pdf; ComponentLink2Description: JLCPCB Part URL; ComponentLink2URL: https://jlcpcb.com/partdetail/C5182421; ComponentLink3Description: LCSC Part URL; ComponentLink3URL: https://lcsc.com/product-detail/Multilayer-Ceramic-Capacitors-MLCC---SMD-SMT_YAGEO-YAGEO-CC0603CRNPO9BN1R6_C5182421.html
footprint CAP-0603 (0603 (1608M) Capacitor)
pins: 1, 2

## CC0603CRNPO9BN1R8
designator C?  Capacitance: 1.8pF  (hidden comment: *)
Capacitor, Ceramic (MLCC), 1.8pF, 50V, NP0, SMD 0603; Manufacturer: YAGEO; Manufacturer Part Number: CC0603CRNPO9BN1R8; Package Size: 0603; JLCPCB Basic Part: No; JLCPCB Part Number: C282244; Supplier 1: LCSC; Category: Capacitors - MLCC; Supplier Part Number 1: C282244; Voltage Rating: 50V; Temperature Coefficient: NP0; RoHS: Yes; ComponentLink1Description: Datasheet; ComponentLink1URL: https://wmsc.lcsc.com/wmsc/upload/file/pdf/v2/lcsc/2304140030_YAGEO-CC0603CRNPO9BN1R8_C282244.pdf; ComponentLink2Description: JLCPCB Part URL; ComponentLink2URL: https://jlcpcb.com/partdetail/C282244; ComponentLink3Description: LCSC Part URL; ComponentLink3URL: https://lcsc.com/product-detail/Multilayer-Ceramic-Capacitors-MLCC---SMD-SMT_YAGEO-YAGEO-CC0603CRNPO9BN1R8_C282244.html
footprint CAP-0603 (0603 (1608M) Capacitor)
pins: 1, 2
